# Altium footprint library MH_DA_THU_VIEN_16122016.PcbLib: 531 footprints (part 12 of 34)
Each footprint in its own frame and in the unit in brackets; x right, y up, seen from the top. Pads: shape width x height; smd on the part's side, far side on the other; paste and mask are expansions set on the pad; w line width, h text height; cw(c..) or ccw(c..) is an arc to the next point about the centre after c.
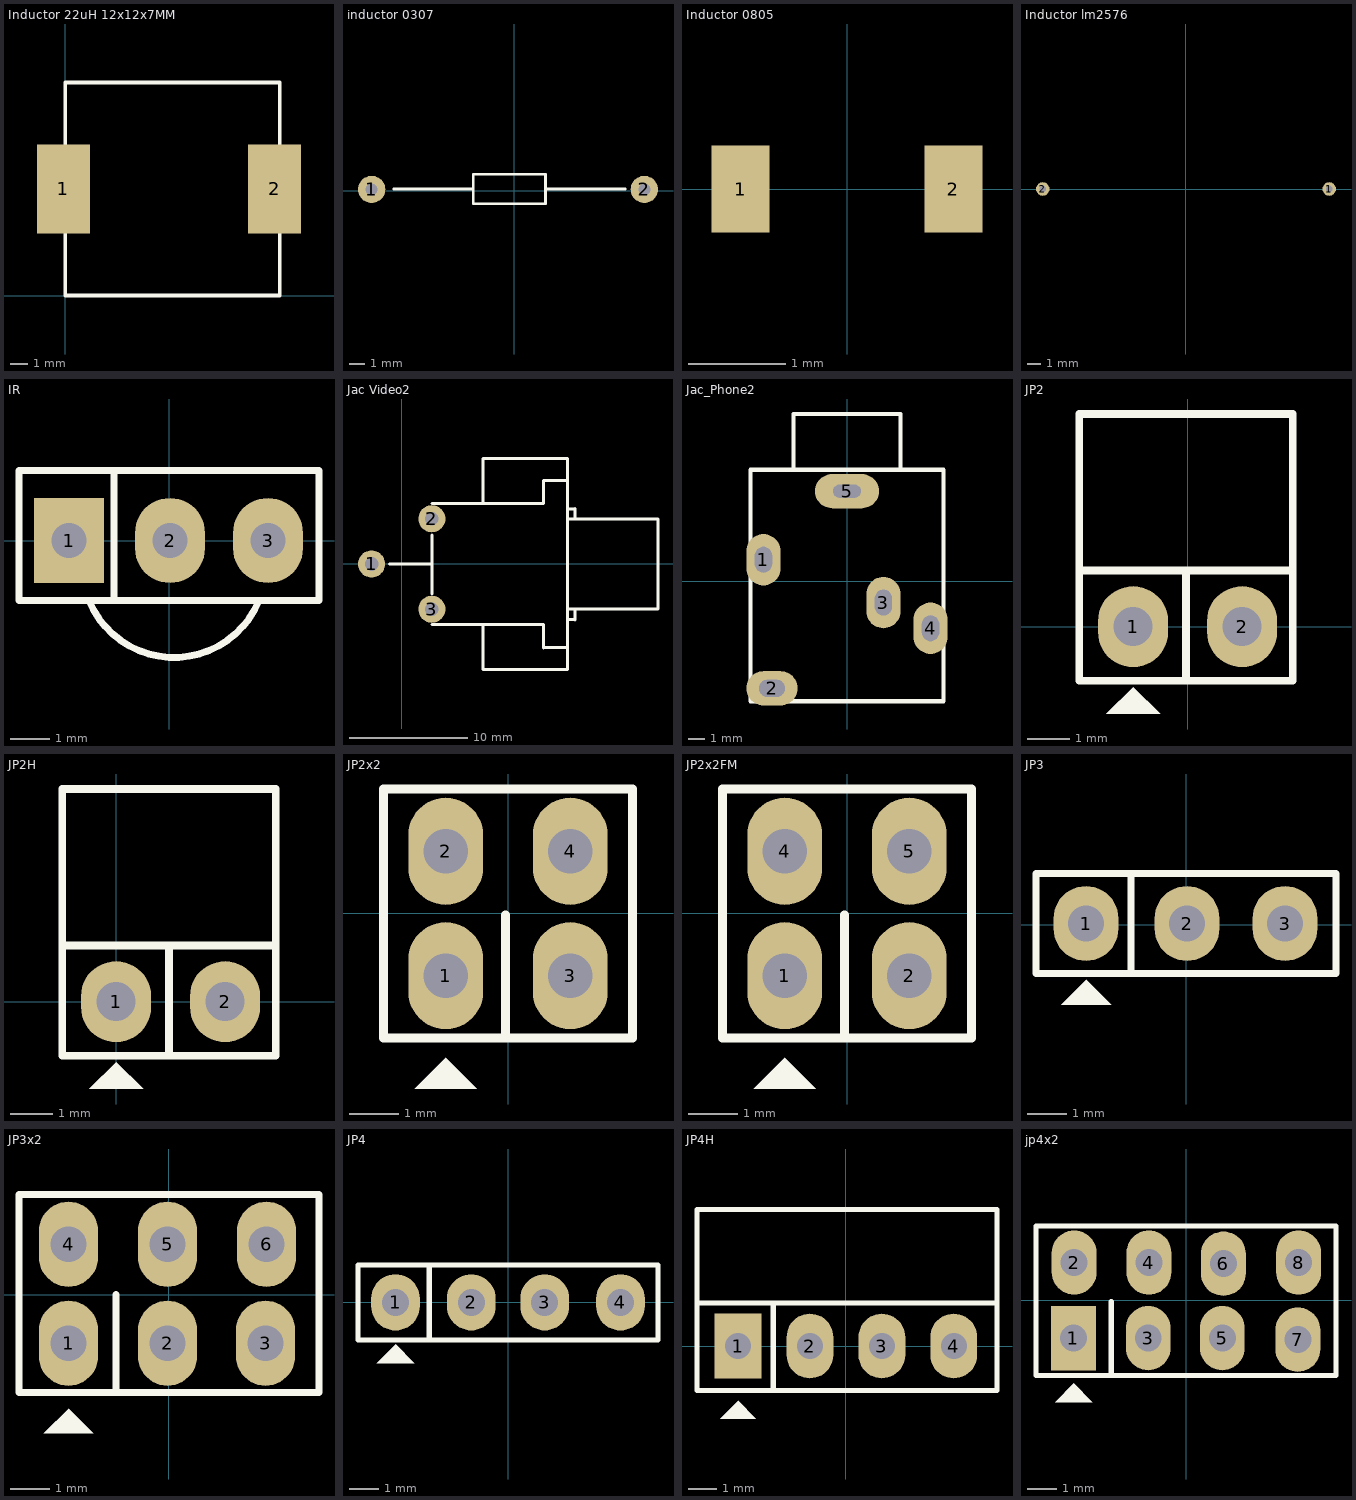
[diagram p11: the footprints below, top view; thin cyan lines are the x and y axes]

## Inductor 22uH 12x12x7MM [mm]
pads (2):
  rect 3x5 smd: 1(-0.1,6) 2(11.8,6)
Top Overlay:
  lines w0.2: 0,0 12.1,0 12.1,12 0,12 0,0
3D body: height 6, standoff 0, extent -0.25,-0.25 12.25,12.25

## inductor 0307 [mil]
pads (2):
  round 70 hole 31: 1(-366.14,3.94) 2(333.86,3.94)
Top Overlay:
  lines w7: -309.14,4.94 -105.14,4.94 ; 79.86,4.94 284.86,4.94 ; -105.14,-33.06 -105.14,42.94 79.86,42.94 79.86,-33.06 -105.14,-33.06
3D body: height 142, standoff -125, extent -361.89,-61.06 339.61,70.94

## Inductor 0805 [mm]
pads (2):
  rect 0.6x0.9 smd: 1(-1.1,0) 2(1.1,0)
3D body: height 0.95, standoff 0, extent -1,-0.6 1,0.6

## Inductor lm2576 [mm]
pads (2):
  round 1 hole 0.5: 1(10.6,0) 2(-10.6,0)
3D body: height 18.91, standoff -34.91, extent -19.351,-8.4 21.151,8.849

## IR [mil] "Receiver Infared IC"
height 200
pads (3):
  rect 70x85 hole 35: 1(-100,0)
  oval 70x85 hole 35: 2(1,0) 3(99,0)
Top Overlay:
  lines w7: -80,-60 ccw(c5,-25) 90,-60 ; -55,-60 -55,70 ; -150,-60 -150,70 150,70 150,-60 -150,-60

## Jac Video2 [mil] "Jac Video Stereo"
pads (3):
  round 90 hole 45: 1(-100,0) 2(100,150) 3(100,-150)
Top Overlay:
  lines w10: -40,0 101,0 ; 100,-200 470,-200 ; 100,200 470,200 470,277 550,277 ; 101,-99 101,96 ; 270,200 270,350 550,350 ; 470,-277 548,-277 549,-276 ; 550,-277 550,-350 270,-350 ; 550,-150 850,-150 850,150 550,150 ; 551,-184 574,-184 575,-185 575,-151 ; 551,183 574,183 575,184 575,150 ; 270,-350 270,-200 270,-350 ; 470,-200 470,-278 470,-200 ; 550,277 550,350 ; 550,277 550,350 ; 550,-275 550,275 550,-275

## Jac_Phone2 [mil] "Jac Phone Stereo"
pads (5):
  oval 80x120 hole 40 slot 60 at 90 deg: 1(-195,50) 3(85,-50) 4(195,-110)
  oval 120x80 hole 40 slot 60 at 0 deg: 2(-175,-250)
  oval 150x80 hole 30 slot 65 at 0 deg: 5(0,210)
Top Overlay:
  lines w10: -125,262 -125,390 125,390 125,262 ; 223,-280 -225,-280 ; -225,-280 -225,260 ; -225,-280 -225,260 ; -225,260 225,260 ; 225,260 225,-280 225,260

## JP2 [mil]
pads (2):
  oval 65x75 hole 36: 1(-50.5,0) 2(50.5,0)
Top Overlay:
  region: -50.5,-56 -75.5,-81 -25.5,-81
  lines w7: -1.5,-50 -1.5,49 ; 97.5,54 97.5,197 -100.5,197 -100.5,52 ; -100.5,52 97.5,52 97.5,-50 -100.5,-50 -100.5,52
3D body: height 99.03, standoff -93.89, extent -94.63,-14.29 97.5,424.29

## JP2H [mil]
pads (2):
  oval 65x75 hole 36: 1(0,0) 2(101,0)
Top Overlay:
  region: 0,-56 -25,-81 25,-81
  lines w7: 49,-50 49,49 ; 148,54 148,197 -50,197 -50,52 ; -50,52 148,52 148,-50 -50,-50 -50,52
3D body: height 99.03, standoff -93.89, extent -44.13,-14.29 148,424.29

## JP2x2 [mil]
pads (4):
  oval 60x86 hole 36: 1(-50,-50) 2(-50,50) 3(50,-50) 4(50,50)
Top Overlay:
  region: -50,-116 -75,-141 -25,-141
  lines w7: -2,-100 -2,-1 ; -100,-100 -100,0 -100,100 100,100 100,-100 -100,-100
3D body: height 335.25, standoff -117.51, extent -99.99,-99.99 100.01,100.01

## JP2x2FM [mil]
pads (4):
  oval 60x86 hole 36: 1(-50,-50) 2(50,-50) 4(-50,50) 5(50,50)
Top Overlay:
  region: -50,-116 -75,-141 -25,-141
  lines w7: -2,-100 -2,-1 ; -100,-100 -100,0 -100,100 100,100 100,-100 -100,-100
3D body: height 335.25, standoff -125.38, extent -104.92,-98.43 104.92,98.43

## JP3 [mil]
pads (3):
  oval 65x75 hole 36: 1(-100,1) 2(1,1) 3(99,1)
Top Overlay:
  region: -100,-55 -125,-80 -75,-80
  lines w7: -55,-49 -55,50 ; -150,-49 150,-49 150,51 -150,51 -150,-49
3D body: height 355.04, standoff -124.88, extent -150,-58.96 150,56

## JP3x2 [mil]
pads (6):
  oval 60x86 hole 36: 1(-101,-49) 2(-1,-49) 3(98,-49) 4(-101,51) 5(-1,51) 6(99,51)
Top Overlay:
  region: -101,-115 -126,-140 -76,-140
  lines w7: -53,-99 -53,0 ; -151,-99 -151,1 -151,101 152,101 152,-99 -151,-99
3D body: height 335.24, standoff -117.51, extent -150.99,-99 149.01,101

## JP4 [mil] "Jumper 4"
height 200
pads (4):
  oval 65x75 hole 36: 1(-150,0) 2(-49,0) 3(49,0) 4(150,0)
Top Overlay:
  region: -150,-56 -175,-81 -125,-81
  lines w7: -105,-50 -105,49 ; -200,-50 200,-50 200,50 -200,50 -200,-50
3D body: height 323.44, standoff -117.51, extent -198.03,-48.43 198.03,50

## JP4H [mil]
pads (4):
  rect 65x90 hole 36: 1(-150,0)
  oval 65x90 hole 36: 2(-50,0) 3(50,0) 4(150,0)
Top Overlay:
  region: -150,-76 -175,-101 -125,-101
  lines w7: -101,-60 -101,58 ; 210,60 -207,60 ; -207,60 -207,-62 210,-62 210,-11 210,190 -207,190 -207,60
3D body: height 99.03, standoff -93.89, extent -194.13,-14.29 -2,424.29
3D body: height 99.03, standoff -93.89, extent 5.87,-14.29 198,424.29

## jp4x2 [mil]
pads (8):
  rect 60x86 hole 36: 1(-150.5,-50.5)
  oval 60x86 hole 36: 2(-149.5,50.5) 3(-50.5,-50.5) 4(-49.5,50.5) 5(48.5,-50.5) 6(50,49) 7(149.5,-52.5) 8(150.5,50.5)
Top Overlay:
  region: -150,-111 -175,-136 -125,-136
  lines w7: -100,-100 -100,-2 ; -200.5,-100.5 200.5,-100.5 200.5,99.5 -200.5,99.5 -200.5,-0.5 -200.5,-100.5
3D body: height 335.25, standoff -117.51, extent -196.99,-100.99 203.01,99.01